# Altium footprint library IDETEC.PcbLib: 275 footprints (part 2 of 18)
Each footprint in its own frame and in the unit in brackets; x right, y up, seen from the top. Pads: shape width x height; smd on the part's side, far side on the other; paste and mask are expansions set on the pad; w line width, h text height; cw(c..) or ccw(c..) is an arc to the next point about the centre after c.
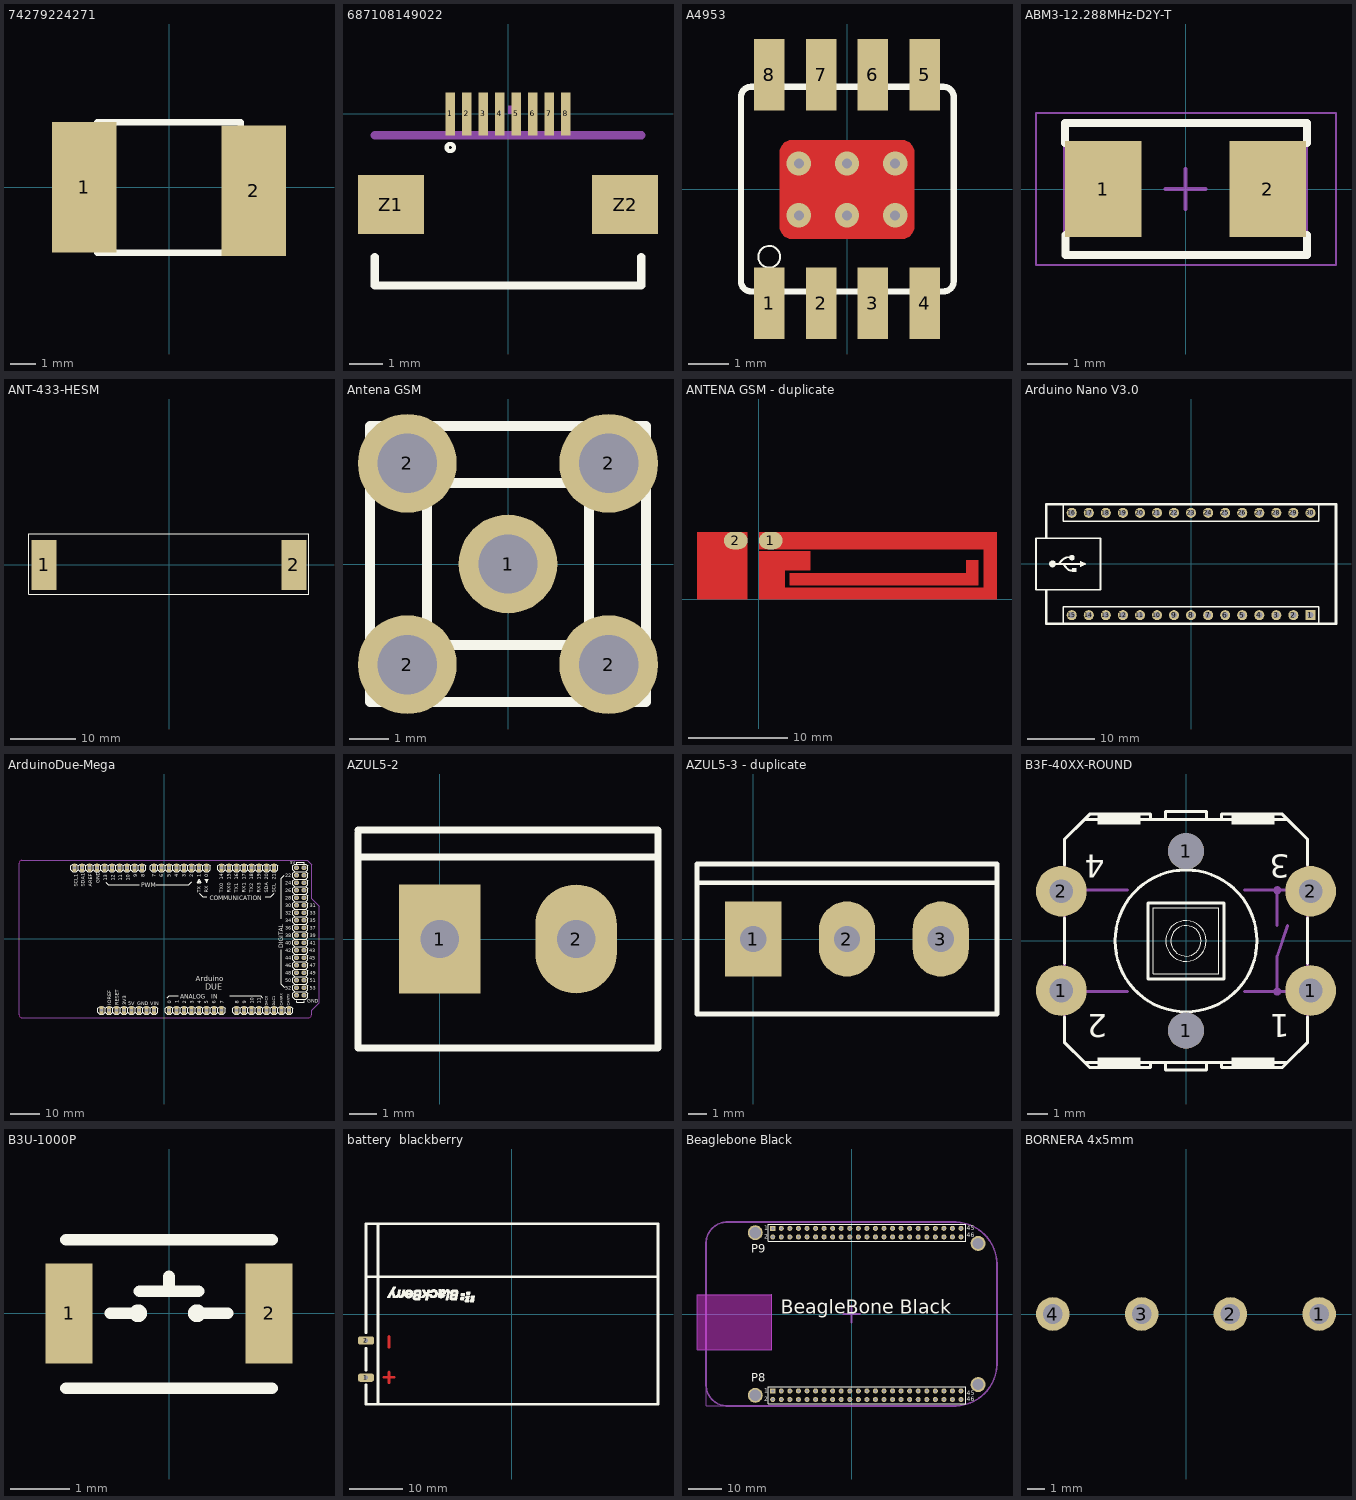
[diagram p1: the footprints below, top view; thin cyan lines are the x and y axes]

## 74279224271 [mil] "INDUCTOR 270R"
pads (2):
  rect 98.43x200 smd: 1(-130,0) 2(130,-5)
Top Overlay:
  lines w10: -110.04,-100 110.04,-100 110.04,100 -110.04,100 -110.04,-100

## 687108149022 [mm]
pads (10):
  rect 0.3x1.3 smd: 1(-1.75,0) 2(-1.25,0) 3(-0.75,0) 4(-0.25,0) 5(0.25,0) 6(0.75,0) 7(1.25,0) 8(1.75,0)
  rect 2x1.8 smd: Z1(-3.55,-2.75) Z2(3.55,-2.75)
Top Overlay:
  circle w0.127: c-1.75,-1.02 r0.11
  lines w0.254: -4.04,-4.342 -4.04,-5.207 4.04,-5.207 4.04,-4.342
Mechanical 16:
  lines w0.254: -4.04,-0.65 4.05,-0.65
Mechanical 27:
  region: 0,0 0.254,0 0.254,0.254 0,0.254
3D body "c-1734592-8-c-3d.stp": height 2.2, standoff 0.15, extent -4.715,-5.217 4.715,-0.107

## A4953 [mm] "SOIC-8 With Termal Pad"
pads (8):
  rect 0.75x1.75 smd: 1(-1.905,-2.79) 2(-0.635,-2.79) 3(0.635,-2.79) 4(1.905,-2.79) 5(1.905,2.811) 6(0.635,2.811) 7(-0.635,2.811) 8(-1.905,2.811)
via 0,0.636 diameter 0.6 hole 0.25
via 1.178,0.636 diameter 0.6 hole 0.25
via -1.178,0.636 diameter 0.6 hole 0.25
via -1.178,-0.635 diameter 0.6 hole 0.25
via 1.177,-0.635 diameter 0.6 hole 0.25
via 0,-0.635 diameter 0.6 hole 0.25
Top Layer:
  region: -1.35,-1.205 -1.41,-1.205 -1.52,-1.159 -1.604,-1.075 -1.65,-0.965 -1.65,-0.905 -1.65,0.905 -1.65,0.965 -1.604,1.075 -1.52,1.159 -1.41,1.205 -1.35,1.205 1.35,1.205 1.41,1.205 1.52,1.159 1.604,1.075 1.65,0.965 1.65,0.905 1.65,-0.905 1.65,-0.965 1.604,-1.075 1.52,-1.159 1.41,-1.205 1.35,-1.205
Top Overlay:
  circle w0.051: c-1.906,-1.651 r0.267
  lines w0.152: -2.6,-2.25 ccw(c-2.35,-2.25) -2.35,-2.5 ; -2.6,-2.24 -2.6,2.261 cw(c-2.348,2.263) -2.35,2.515 ; -2.21,-2.5 -2.34,-2.5 2.362,-2.5 ccw(c2.364,-2.248) 2.616,-2.25 2.616,2.261 ccw(c2.362,2.261) 2.362,2.515 ; -2.21,2.515 -2.34,2.515 2.362,2.515 ; -1.59,-2.5 -0.95,-2.5 ; -1.59,2.515 -0.95,2.515 ; -0.33,-2.5 0.33,-2.5 ; -0.32,2.515 0.33,2.515 ; 0.965,-2.5 1.6,-2.5 ; 0.965,2.515 1.6,2.515 ; 2.21,-2.5 2.337,-2.5 ; 2.235,2.515 2.362,2.515
3D body "User Library-SOIC127P500X620X175-8.STEP": height 1.75, standoff 0, extent -2.5,-3.114 2.5,3.115

## ABM3-12.288MHz-D2Y-T [mm] "Crystals 12.288MHz 18pF 30ppm -40C +85C"
height 1.3
pads (2):
  rect 1.9x2.4 smd: 1(-2.05,0) 2(2.05,0)
Top Overlay:
  lines w0.2: -3.003,1.15 -3.003,1.65 3.022,1.65 3.022,1.15 ; -2.995,-1.15 -2.995,-1.65 3.024,-1.65 3.024,-1.15
Mechanical 13:
  lines w0.1: -3.005,-1.6 -3.005,1.6 3.005,1.6 3.005,-1.6 -3.005,-1.6
Mechanical 15:
  lines w0.05: -3.728,-1.9 3.748,-1.9 3.748,1.9 -3.728,1.9 -3.728,-1.9
  lines w0.1: -0.5,0 0.5,0 ; 0,-0.5 0,0.5
3D body "User Library-ABM3.STEP": height 1.3, standoff 0, extent -2.6,-1.7 2.6,1.7

## ANT-433-HESM [mm] "ANT 433MHz"
height 5
pads (2):
  rect 3.81x7.62 smd: 1(-19.05,0) 2(19.05,0)
Top Overlay:
  lines w0.15: -21.377,-4.471 -21.377,4.739 21.267,4.739 21.267,-4.471 -21.377,-4.471
3D body "Antena A.STEP": height 6.25, standoff -0.05, extent -19.471,2.234 -5.671,11.384
3D body "Medio.STEP": height 6.25, standoff -0.05, extent -7.167,5.175 6.633,11.475
3D body "Medio.STEP": height 6.25, standoff -0.05, extent 5.488,5.212 19.288,11.512

## Antena GSM [mm] "antena GSM"
height 5
pads (5):
  round 2.5 hole 1.5: 1(0,0) 2(-2.55,-2.55) 2(-2.55,2.55) 2(2.55,-2.55) 2(2.55,2.55)
Top Overlay:
  lines w0.254: -3.5,-3.5 -3.5,3.5 3.5,3.5 3.5,-3.5 -3.5,-3.5 ; -2.05,-2.05 2.05,-2.05 2.05,2.05 -2.05,2.05 -2.05,-2.05
3D body "User Library-SMA_AntennaR.STEP": height 48.75, standoff 1.89, extent -4.475,8.875 4.525,27.125
3D body "7644.STEP": height 9.85, standoff -3.68, extent -3.145,-3.175 3.195,11.646

## ANTENA GSM - duplicate [mm] "ANTENA GSM"
height 1
pads (2):
  oval 2.4x1.76 smd: 1(1.2,5.92) 2(-2.34,5.92)
Top Layer:
  rectangle: -6.24,0 -1.14,6.8
  region: 22.16,1.39 22.16,3.95 20.86,3.95 20.86,1.39
  rectangle: 3.08,1.39 22.16,2.67
  rectangle: 0,2.88 5.18,4.86
  region: 2.62,4.86 0,4.86 0,0 2.62,0
  rectangle: 0,0 24,1.18
  rectangle: 22.62,0 24,6.8
  rectangle: 0,5.04 24,6.8
  text "I&T01" at 20.15,4.49 h1.4

## Arduino Nano V3.0 [mm] "Arduino Nano R 3.0"
height 8
pads (30):
  rect 1.5x1.5 hole 0.9: 1(17.78,-7.62)
  round 1.5 hole 0.9: 2(15.24,-7.62) 3(12.7,-7.62) 4(10.16,-7.62) 5(7.62,-7.62) 6(5.08,-7.62) 7(2.54,-7.62) 8(0,-7.62) 9(-2.54,-7.62) 10(-5.08,-7.62) 11(-7.62,-7.62) 12(-10.16,-7.62) 13(-12.7,-7.62) 14(-15.24,-7.62) 15(-17.78,-7.62) 16(-17.78,7.62) 17(-15.24,7.62) 18(-12.7,7.62) 19(-10.16,7.62) 20(-7.62,7.62) 21(-5.08,7.62) 22(-2.54,7.62) 23(0,7.62) 24(2.54,7.62) 25(5.08,7.62) 26(7.62,7.62) 27(10.16,7.62) 28(12.7,7.62) 29(15.24,7.62) 30(17.78,7.62)
Top Overlay:
  drawing of 191 lines, arcs and shapes, not listed
3D body "User Library-Nano-1.STEP": height 13.58, standoff -4.98, extent -23.33,-8.89 21.59,8.9

## ArduinoDue-Mega [mil] "Tarjeta ArduinoDue/Mega"
pads (86):
  oval 56x112 hole 33.46: 0(560.32,949.63) 1(460.31,949.63) 2(360.31,949.63) 3(260.31,949.63) 3V3(-539.68,-950.37) 4(160.31,949.63) 5(60.31,949.63) 5V(-439.69,-950.37) 6(-39.69,949.63) 7(-139.69,949.63) 8(-299.69,949.63) 9(-399.69,949.63) 10(-499.69,949.63) 11(-599.68,949.63) 12(-699.68,949.63) 13(-799.68,949.63) 14(760.32,949.63) 15(860.32,949.63) 16(960.32,949.63) 17(1060.32,949.63) 18(1160.32,949.63) 19(1260.32,949.63) 20(1360.32,949.63) 21(1460.32,949.63) A0(60.31,-950.37) A1(160.31,-950.37) A2(260.31,-950.37) A3(360.31,-950.37) A4(460.31,-950.37) A5(560.32,-950.37) A6(660.32,-950.37) A7(760.32,-950.37) A8(960.32,-950.37) A9(1060.32,-950.37) A10(1160.32,-950.37) A11(1260.32,-950.37) AREF(-999.68,949.63) CAN_R(1560.32,-950.37) CAN_T(1660.32,-950.37) DAC0(1360.32,-950.37) DAC1(1460.32,-950.37) GND(-899.68,949.63) GND(-339.69,-950.37) GND(-239.69,-950.37) IOREF(-739.68,-950.37) RESET(-639.68,-950.37) SCL(-1199.68,949.63) SDA(-1099.68,949.63) VIN(-139.69,-950.37) ""(-839.68,-950.37)
  oct 66x66 hole 37.4: 5V(1760.32,949.63) 5V(1860.32,949.63) 22(1760.32,849.63) 23(1860.32,849.63) 24(1760.32,749.63) 25(1860.32,749.63) 26(1760.32,649.63) 27(1860.32,649.63) 28(1760.32,549.63) 29(1860.32,549.63) 30(1760.32,449.63) 31(1860.32,449.63) 32(1760.32,349.63) 33(1860.32,349.63) 34(1760.32,249.63) 35(1860.32,249.63) 36(1760.32,149.63) 37(1860.32,149.63) 38(1760.32,49.63) 39(1860.32,49.63) 40(1760.32,-50.37) 41(1860.32,-50.37) 42(1760.32,-150.37) 43(1860.32,-150.37) 44(1760.32,-250.37) 45(1860.32,-250.37) 46(1760.32,-350.37) 47(1860.32,-350.37) 48(1760.32,-450.37) 49(1860.32,-450.37) 50(1760.32,-550.37) 51(1860.32,-550.37) 52(1760.32,-650.37) 53(1860.32,-650.37) GND(1760.32,-750.37) GND(1860.32,-750.37)
Top Overlay:
  drawing of 580 lines, arcs and shapes, not listed
  text "IOREF" at -710.86,-882.89 h47.6
  text "SCL1" at -1157.86,693.11 h47.6
  text "SDA1" at -1065.86,693.11 h47.6
  text "DUE" at 542.32,-676.37 h76.5
  text "DIGITAL" at 1585.32,-125.37 h56.1
  text "52" at 1610.32,-675.37 h47.6
  text "53" at 1935.32,-675.37 h47.6
  text "48" at 1610.32,-475.37 h47.6
  text "50" at 1610.32,-575.37 h47.6
  text "46" at 1610.32,-375.37 h47.6
  text "44" at 1610.32,-275.37 h47.6
  text "51" at 1935.32,-575.37 h47.6
  text "49" at 1935.32,-475.37 h47.6
  text "47" at 1935.32,-375.37 h47.6
  text "45" at 1930.32,-275.37 h47.6
  text "42" at 1610.32,-175.37 h47.6
  text "43" at 1930.32,-175.37 h47.6
  text "40" at 1610.32,-75.37 h47.6
  text "41" at 1935.32,-75.37 h47.6
  text "39" at 1935.32,24.63 h47.6
  text "38" at 1610.32,24.63 h47.6
  text "37" at 1935.32,124.63 h47.6
  text "36" at 1610.32,124.63 h47.6
  text "35" at 1935.32,224.63 h47.6
  text "34" at 1610.32,224.63 h47.6
  text "33" at 1935.32,324.63 h47.6
  text "32" at 1610.32,324.63 h47.6
  text "31" at 1935.32,424.63 h47.6
  text "30" at 1610.32,424.63 h47.6
  text "28" at 1610.32,524.63 h47.6
  text "26" at 1610.32,624.63 h47.6
  text "24" at 1610.32,724.63 h47.6
  text "22" at 1610.32,824.63 h47.6
  text "GND" at 1900.32,-850.37 h47.6
  text "5V" at 1678,997.24 h37.4
  text "21" at 1485.32,789.63 h47.6
  text "20" at 1385.32,789.63 h47.6
  text "19" at 1285.32,789.63 h47.6
  text "18" at 1185.32,789.63 h47.6
  text "17" at 1085.32,789.63 h47.6
  text "16" at 985.32,789.63 h47.6
  text "15" at 885.32,789.63 h47.6
  text "14" at 785.32,789.63 h47.6
  text "PWM" at -308.82,691.63 h59.76
  text "TX2" at 1185.32,619.63 h47.6
  text "RX3" at 1285.32,619.63 h47.6
  text "TX0" at 785.32,619.63 h47.6
  text "RX0" at 885.32,619.63 h47.6
  text "RX1" at 1085.32,619.63 h47.6
  text "TX1" at 985.32,619.63 h47.6
  text "CANTX" at 1673.32,-889.37 h34
  text "CANRX" at 1578.32,-889.37 h34
  text "DAC1" at 1478.32,-889.37 h34
  text "DAC0" at 1378.32,-889.37 h34
  text "11" at 1282.32,-865.37 h47.6
  text "10" at 1190.32,-865.37 h47.6
  text "9" at 1090.32,-865.37 h47.6
  text "8" at 990.32,-865.37 h47.6
  text "SCL" at 1485.32,619.63 h47.6
  text "SDA" at 1385.32,619.63 h47.6
  text "7" at 790.32,-865.37 h47.6
  text "5" at 585.32,-865.37 h47.6
  text "4" at 490.31,-865.37 h47.6
  text "3" at 390.31,-865.37 h47.6
  text "2" at 290.31,-865.37 h47.6
  text "0" at 90.31,-865.37 h47.6
  text "13" at -764.68,774.63 h47.6
  text "12" at -664.68,774.63 h47.6
  text "11" at -564.68,774.63 h47.6
  text "10" at -464.69,774.63 h47.6
  text "9" at -364.69,824.63 h47.6
  text "8" at -264.69,824.63 h47.6
  text "7" at -114.69,824.63 h47.6
  text "6" at -14.69,824.63 h47.6
  text "5" at 85.31,824.63 h47.6
  text "4" at 185.31,824.63 h47.6
  text "3" at 285.31,824.63 h47.6
  text "2" at 385.31,824.63 h47.6
  text "1" at 485.31,824.63 h47.6
  text "0" at 585.32,824.63 h47.6
  text "GND" at -360.2,-882.2 h47.6
  text "VIN" at -188.21,-882.2 h47.6
  text "5V" at -480.2,-882.2 h47.6
  text "3V3" at -510.86,-882.89 h47.6
  text "RESET" at -610.86,-882.89 h47.6
  text "Arduino" at 418.31,-566.37 h68
  text "GND" at -860.43,740.11 h47.6
  text "AREF" at -965.86,693.11 h47.6
  text "ANALOG   IN" at 211.31,-796.37 h56.1
  text "1" at 188.94,-859.55 h47.6
  text "6" at 686.42,-865.37 h47.6
  text "RX" at 585.32,619.63 h47.6
  text "TX" at 485.31,619.63 h47.6
  text "COMMUNICATION" at 604.65,518.86 h56.1
Keep-Out Layer:
  lines w10: -1939.68,-1011 ccw(c-1900.32,-1011) -1900.32,-1050.37 ; -1939.68,1010.26 cw(c-1900.32,1010.26) -1900.32,1049.63 ; 1920.94,-1050.37 ccw(c1920.94,-1011) 1960.31,-1011
Mechanical 1:
  lines w10: -1939.68,-1011 -1939.68,1010.26 ; -1900.32,-1050.37 1920.94,-1050.37 ; -1900.32,1049.63 1900.32,1049.63 1960.32,989.63 1960.32,539.63 2060.32,439.63 2060.32,-850.37 1960.32,-950.37 1960.32,-1011
3D body "User Library-ARDUINO DUE.STEP": height 74.8, standoff -500, extent -2016.34,-1047.48 2057.68,1052.52

## AZUL5-2 [mm]
pads (2):
  rect 3x4 hole 1.4: 1(0,0)
  oval 3x4 hole 1.4: 2(5,0)
Top Overlay:
  lines w0.254: -3,3 8,3 ; -3,3.9 -3,0 -3,-4 8,-4 8,4 -3,4
3D body "User Library-Bornera2.STEP": height 10.75, standoff -3.95, extent -2.5,-3.852 7.5,9.602

## AZUL5-3 - duplicate [mm] "bornera azul"
pads (3):
  rect 3x4 hole 1.4: 1(0,0)
  oval 3x4 hole 1.4: 2(5,0) 3(10,0)
Top Overlay:
  lines w0.254: -3,3 13,3 ; -3,-4 13,-4 13,4 -3,4 -3,0 -3,-4
3D body "User Library-Bornera3.STEP": height 10.74, standoff -3.95, extent -2.475,-3.877 12.525,9.577

## B3F-40XX-ROUND [mil] "B3F-40XX-ROUND"
height 287.4
pads (6):
  round 100 hole 47: 1(-246,-98) 1(246,-98) 2(-246,98) 2(246,98)
  round 71 hole 71: 1(0,-177) 1(0,177)
Top Overlay:
  circle w2: c0,0 r30
  circle w2: c0,0 r40
  circle w6: c0,0 r140
  region: 175,250 90,250 90,230 175,230
  region: -90,250 -175,250 -175,230 -90,230
  region: 175,-230 90,-230 90,-250 175,-250
  region: -90,-230 -175,-230 -175,-250 -90,-250
  lines w2: -65,-65 -65,65 65,65 65,-65 -65,-65
  lines w6: -240,-150 -240,-200 -200,-240 ; -240,-45 -240,45 ; -240,150 -240,200 -200,240 ; 240,-150 240,-200 200,-240 ; 240,-45 240,45 ; 240,150 240,200 200,240 ; -200,-240 -190,-250 -70,-250 -70,-240 ; -200,-240 -70,-240 ; -200,240 -190,250 -70,250 -70,240 ; -200,240 -70,240 ; -70,-240 -40,-240 ; -70,240 -40,240 ; -40,-240 -40,-255 40,-255 40,-240 ; -40,-240 40,-240 ; -40,240 40,240 ; -40,240 -40,255 40,255 40,240 ; 40,-240 70,-240 ; 40,240 70,240 ; 70,-240 70,-250 190,-250 200,-240 ; 70,-240 200,-240 ; 70,240 70,250 190,250 200,240 ; 70,240 200,240 ; -75,-75 -75,75 75,75 75,-75 -75,-75
  text "4" at -160,185 h77.5
  text "3" at 205,185 h77.5
  text "2" at -155,-130 h77.5
  text "1" at 205,-130 h77.5
Mechanical 30:
  circle w6: c180,100 r5
  circle w6: c180,-100 r5
  region: 260,115 240,115 240,80 260,80
  region: 260,-80 240,-80 240,-115 260,-115
  region: -240,-80 -260,-80 -260,-115 -240,-115
  region: -240,115 -260,115 -260,80 -240,80
  lines w6: -240,-150 -240,-45 ; -240,45 -240,150 ; -200,-100 -115,-100 ; -200,100 -115,100 ; 115,-100 180,-100 ; 115,100 180,100 ; 180,30 180,100 ; 200,-100 180,-100 ; 200,30 180,-30 180,-100 ; 200,100 180,100 ; 240,-150 240,-45 ; 240,45 240,150
3D body "Tactile Push Button THT 12x12mm H8.50mm (Würth 430476085716).stp": height 336.61, standoff -132.62, extent -275.67,-236.21 275.69,236.23

## B3U-1000P [mm] "OMRON Ultra-small Tactile Switch"
height 1.6
pads (2):
  rect 0.8x1.7 smd: 1(-1.7,0) 2(1.7,0)
Top Overlay:
  circle w0.254: c-0.525,0 r0.025
  circle w0.254: c0.475,0 r0.025
  lines w0.2: -1.75,-1.275 1.75,-1.275 ; -1.75,1.25 1.75,1.25 ; -1,0 -0.5,0 ; -0.5,0.375 0.5,0.375 ; 0,0.375 0,0.625 ; 0.5,0 1,0
3D body "OMRON B3U1000P.STEP": height 1.6, standoff 0, extent -2,-1.25 2,1.25

## battery  blackberry [mm] "bateria blackberry C-52"
height 6
pads (2):
  rrect50% 3x1.524 hole 0.762: 1(-27.5,-12) 2(-27.5,-5)
Top Layer:
  lines w0.5: -24.17,-11.92 -23.17,-11.92 -22.17,-11.92 ; -23.17,-12.92 -23.17,-10.92 ; -23.17,-6.25 -23.17,-4.25
Top Overlay:
  drawing of 1020 lines, arcs and shapes, not listed
Mechanical 1:
  lines w0.051: 27.475,-16.95 27.475,16.95

## Beaglebone Black [mm] "Module beaglebone black"
height 26
pads (96):
  rect 1.5x1.5 hole 0.9: 8_1(-23.382,-22.845) 9_1(-23.382,25.415)
  round 1.5 hole 0.9: 8_2(-23.382,-25.385) 8_3(-20.842,-22.845) 8_4(-20.842,-25.385) 8_5(-18.302,-22.845) 8_6(-18.302,-25.385) 8_7(-15.762,-22.845) 8_8(-15.762,-25.385) 8_9(-13.222,-22.845) 8_10(-13.222,-25.385) 8_11(-10.682,-22.845) 8_12(-10.682,-25.385) 8_13(-8.142,-22.845) 8_14(-8.142,-25.385) 8_15(-5.602,-22.845) 8_16(-5.602,-25.385) 8_17(-3.062,-22.845) 8_18(-3.062,-25.385) 8_19(-0.522,-22.845) 8_20(-0.522,-25.385) 8_21(2.018,-22.845) 8_22(2.018,-25.385) 8_23(4.558,-22.845) 8_24(4.558,-25.385) 8_25(7.098,-22.845) 8_26(7.098,-25.385) 8_27(9.638,-22.845) 8_28(9.638,-25.385) 8_29(12.178,-22.845) 8_30(12.178,-25.385) 8_31(14.718,-22.845) 8_32(14.718,-25.385) 8_33(17.258,-22.845) 8_34(17.258,-25.385) 8_35(19.798,-22.845) 8_36(19.798,-25.385) 8_37(22.338,-22.845) 8_38(22.338,-25.385) 8_39(24.878,-22.845) 8_40(24.878,-25.385) 8_41(27.418,-22.845) 8_42(27.418,-25.385) 8_43(29.958,-22.845) 8_44(29.958,-25.385) 8_45(32.498,-22.845) 8_46(32.498,-25.385) 9_2(-23.382,22.875) 9_3(-20.842,25.415) 9_4(-20.842,22.875) 9_5(-18.302,25.415) 9_6(-18.302,22.875) 9_7(-15.762,25.415) 9_8(-15.762,22.875) 9_9(-13.222,25.415) 9_10(-13.222,22.875) 9_11(-10.682,25.415) 9_12(-10.682,22.875) 9_13(-8.142,25.415) 9_14(-8.142,22.875) 9_15(-5.602,25.415) 9_16(-5.602,22.875) 9_17(-3.062,25.415) 9_18(-3.062,22.875) 9_19(-0.522,25.415) 9_20(-0.522,22.875) 9_21(2.018,25.415) 9_22(2.018,22.875) 9_23(4.558,25.415) 9_24(4.558,22.875) 9_25(7.098,25.415) 9_26(7.098,22.875) 9_27(9.638,25.415) 9_28(9.638,22.875) 9_29(12.178,25.415) 9_30(12.178,22.875) 9_31(14.718,25.415) 9_32(14.718,22.875) 9_33(17.258,25.415) 9_34(17.258,22.875) 9_35(19.798,25.415) 9_36(19.798,22.875) 9_37(22.338,25.415) 9_38(22.338,22.875) 9_39(24.878,25.415) 9_40(24.878,22.875) 9_41(27.418,25.415) 9_42(27.418,22.875) 9_43(29.958,25.415) 9_44(29.958,22.875) 9_45(32.498,25.415) 9_46(32.498,22.875)
  round 4.45 hole 3.3: ""(-28.57,-24.125) ""(-28.57,24.125) ""(37.59,-20.955) ""(37.59,20.955)
Top Overlay:
  lines w0.2: -24.652,-26.655 -24.652,-21.575 33.846,-21.575 33.846,-26.655 -24.652,-26.655 ; -24.652,21.605 33.846,21.605 33.846,26.685 -24.652,26.685 -24.652,21.605
  text "BeagleBone Black" at -21.073,-1.215 h7
  text "1" at -25.922,24.907 h1.27
  text "2" at -25.922,22.367 h1.27
  text "45" at 34.268,24.907 h1.27
  text "46" at 34.268,22.811 h1.27
  text "P9" at -29.73,18.112 h2.5
  text "P8" at -29.73,-20.07 h2.5
  text "46" at 34.268,-25.893 h1.27
  text "45" at 34.268,-24.121 h1.27
  text "2" at -25.922,-25.893 h1.27
  text "1" at -25.922,-23.353 h1.27
Keep-Out Layer:
  board cut-out: -45.864,-10.668 -45.864,5.768 -23.799,5.768 -23.783,5.768 -23.754,5.756 -23.731,5.733 -23.719,5.704 -23.719,5.688 -23.719,-10.588 -23.719,-10.604 -23.731,-10.633 -23.754,-10.656 -23.783,-10.668 -23.799,-10.668
Mechanical 1:
  lines w0.3: -45.864,5.759 -45.864,-10.668 -23.799,-10.668 ccw(c-23.799,-10.588) -23.719,-10.588 -23.719,5.688 ccw(c-23.799,5.688) -23.799,5.768 -45.864,5.768
Mechanical 15:
  lines w0.05: -43.18,-10.668 -43.18,-27.305 -36.83,-27.305
  lines w0.5: -2.5,0 2.5,0 ; 0,-2.5 0,2.5 ; -43.18,-20.955 ccw(c-36.83,-20.955) -36.83,-27.305 0,-27.305 30.48,-27.305 ccw(c30.48,-14.605) 43.18,-14.605 43.18,14.605 ccw(c30.48,14.605) 30.48,27.305 0,27.305 -36.83,27.305 ccw(c-36.83,20.955) -43.18,20.955 -43.18,-20.955
3D body "User Library-Header_Male_10Pin.STEP": height 8.54, standoff -3, extent -24.652,24.17 0.748,26.66
3D body "User Library-Header_Male_10Pin.STEP": height 8.54, standoff -3, extent -24.652,21.63 0.748,24.12
3D body "User Library-Header_Male_10Pin.STEP": height 8.54, standoff -3, extent 0.748,24.17 26.148,26.66
3D body "User Library-Header_Male_10Pin.STEP": height 8.54, standoff -3, extent 0.748,21.63 26.148,24.12
3D body "User Library-Header_Male_3Pin.STEP": height 8.54, standoff -3, extent 26.148,24.17 33.768,26.66
3D body "User Library-Header_Male_3Pin.STEP": height 8.54, standoff -3, extent 26.148,21.63 33.768,24.12
3D body "User Library-Header_Male_3Pin.STEP": height 8.54, standoff -3, extent 26.148,-26.63 33.768,-24.14
3D body "User Library-Header_Male_3Pin.STEP": height 8.54, standoff -3, extent 26.148,-24.09 33.768,-21.6
3D body "User Library-Header_Male_10Pin.STEP": height 8.54, standoff -3, extent 0.748,-26.63 26.148,-24.14
3D body "User Library-Header_Male_10Pin.STEP": height 8.54, standoff -3, extent 0.748,-24.09 26.148,-21.6
3D body "User Library-Header_Male_10Pin.STEP": height 8.54, standoff -3, extent -24.652,-26.63 0.748,-24.14
3D body "User Library-Header_Male_10Pin.STEP": height 8.54, standoff -3, extent -24.652,-24.09 0.748,-21.6
3D body "BEAGLEBONE_BLACK.STEP": height 16.53, standoff -2.84, extent -45.805,-27.31 44.645,27.35

## BORNERA 4x5mm [mm] "Bornera pitch 5.0mm"
pads (4):
  round 1.9 hole 1.1: 1(7.5,0) 2(2.5,0) 3(-2.5,0) 4(-7.5,0)
3D body "TS-501 3P.STEP": height 11, standoff -4, extent -10.504,-3.174 9.996,4.826